# Altium footprint library VNGS01 V1.31.PcbLib: 36 footprints (part 3 of 3)
Each footprint in its own frame and in the unit in brackets; x right, y up, seen from the top. Pads: shape width x height; smd on the part's side, far side on the other; paste and mask are expansions set on the pad; w line width, h text height; cw(c..) or ccw(c..) is an arc to the next point about the centre after c.
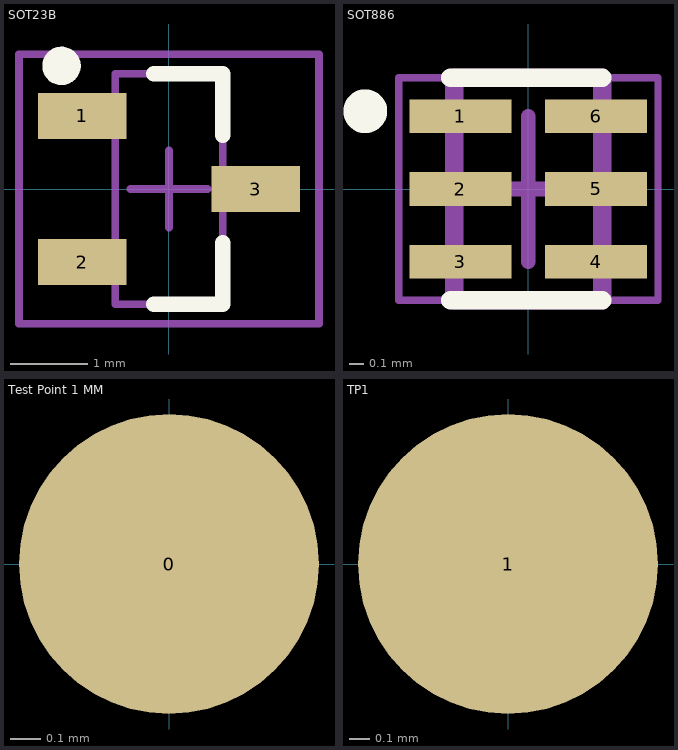
[diagram p2: the footprints below, top view; thin cyan lines are the x and y axes]

## SOT23B [mm] "SOT23, 3-Leads, Body 2.9x1.3mm, Pitch 0.95mm, Lead Span 2.4mm, IPC High Density"
height 1.14
pads (3):
  rect 1.15x0.6 smd: 1(-1.125,0.95) 2(-1.125,-0.95) 3(1.125,0)
Top Overlay:
  circle w0.25: c-1.397,1.6 r0.125
  lines w0.2: -0.2,-1.5 0.7,-1.5 0.7,-0.7 ; -0.2,1.5 0.7,1.5 0.7,0.7
Mechanical 13:
  lines w0.1: -0.7,-1.5 -0.7,1.5 0.7,1.5 0.7,-1.5 -0.7,-1.5
Mechanical 15:
  lines w0.1: -0.5,0 0.5,0 ; 0,-0.5 0,0.5 ; -1.95,-1.75 -1.95,1.75 1.95,1.75 1.95,-1.75 -1.95,-1.75
3D body "SOT23-3.STEP": height 1.05, standoff -0.04, extent -1.25,-1.5 1.25,1.5

## SOT886 [mm] "6-Leads, Body 1.5x1.0mm, Pitch 0.5mm, IPC High Density"
height 0.5
pads (6):
  rect 0.7x0.23 smd mask+0.05: 1(-0.465,0.5) 2(-0.465,0) 3(-0.465,-0.5) 4(0.465,-0.5) 5(0.465,0) 6(0.465,0.5)
Top Overlay:
  circle w0.2: c-1.118,0.533 r0.05
  lines w0.127: -0.533,-0.762 0.508,-0.762 ; -0.533,0.762 0.508,0.762
Mechanical 13:
  lines w0.127: -0.508,-0.762 -0.508,0.762 0.508,0.762 0.508,-0.762 -0.508,-0.762
Mechanical 15:
  lines w0.05: -0.889,-0.762 -0.889,0.762 0.889,0.762 0.889,-0.762 -0.889,-0.762
  lines w0.1: -0.5,0 0.5,0 ; 0,-0.5 0,0.5
3D body "User Library-SOT886 (XSON6).step": height 0.49, standoff -0.01, extent -0.533,-0.763 0.517,0.737

## Test Point 1 MM [mm] "Test Point 1 MM"
pads (1):
  round 1 smd paste-5: 0(0,0)

## TP1 [mm] "TP1, 1mm, 1 layer"
pads (1):
  round 1.5 smd paste-0.75: 1(0,0)
Mechanical 15:
  lines w0.1: -0.3,0 0.3,0 ; 0,-0.3 0,0.3